# Altium footprint library WR-TBL_Spring Clamp.PcbLib: 258 footprints (part 9 of 17)
Each footprint in its own frame and in the unit in brackets; x right, y up, seen from the top. Pads: shape width x height; smd on the part's side, far side on the other; paste and mask are expansions set on the pad; w line width, h text height; cw(c..) or ccw(c..) is an arc to the next point about the centre after c.
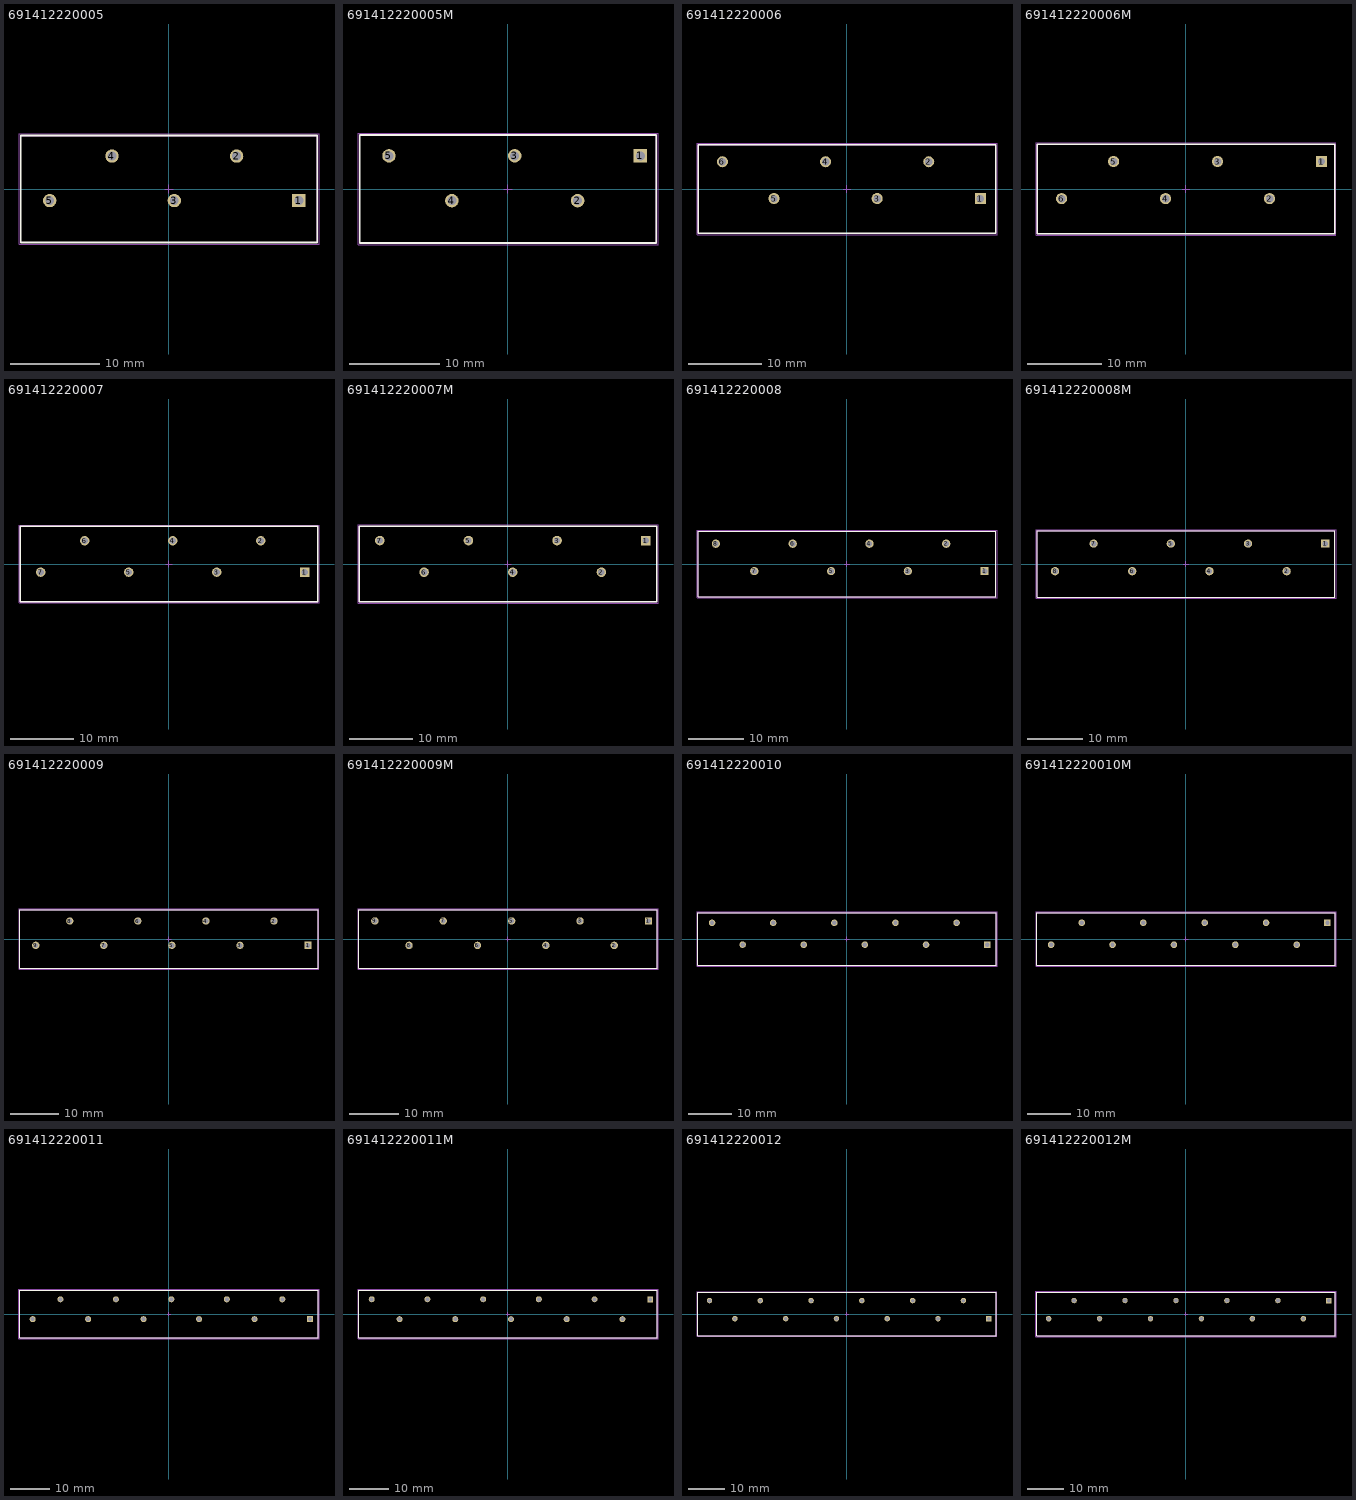
[diagram p8: the footprints below, top view; thin cyan lines are the x and y axes]

## 691412220005 [mm] "7.00 mm Screwless 45deg Entry, 5p"
height 13.2
pads (5):
  rect 1.5x1.5 hole 1: 1(14.595,-1.3)
  round 1.5 hole 1: 2(7.595,3.7) 3(0.595,-1.3) 4(-6.405,3.7) 5(-13.405,-1.3)
Top Overlay:
  lines w0.2: -16.655,-6 -16.655,6 16.655,6 16.655,-6 -16.655,-6
Mechanical 13:
  lines w0.1: -16.655,-6 16.655,-6 16.655,6 -16.655,6 -16.655,-6
Mechanical 15:
  lines w0.05: -0.5,0 0.5,0 ; 0,-0.5 0,0.5 ; -16.855,-6.2 16.855,-6.2 16.855,6.2 -16.855,6.2 -16.855,-6.2
3D body "691412220005.stp": height 13.28, standoff -3.52, extent -16.655,-6 16.655,6

## 691412220005M [mm] "7.00 mm Screwless 45deg Entry Mirror Version, 5p"
height 13.2
pads (5):
  rect 1.5x1.5 hole 1: 1(14.75,3.7)
  round 1.5 hole 1: 2(7.75,-1.3) 3(0.75,3.7) 4(-6.25,-1.3) 5(-13.25,3.7)
Top Overlay:
  lines w0.2: -16.5,-6 -16.5,6 16.5,6 16.5,-6 -16.5,-6
Mechanical 13:
  lines w0.1: -16.5,-6 16.5,-6 16.5,6 -16.5,6 -16.5,-6
Mechanical 15:
  lines w0.05: -0.5,0 0.5,0 ; 0,-0.5 0,0.5 ; -16.7,-6.2 -16.7,6.2 16.7,6.2 16.7,-6.2 -16.7,-6.2
3D body "691412220005M.stp": height 13.28, standoff -3.52, extent -16.5,-6 16.5,6

## 691412220006 [mm] "7.00 mm Screwless 45deg Entry, 6p"
height 13.2
pads (6):
  rect 1.5x1.5 hole 1: 1(18.095,-1.3)
  round 1.5 hole 1: 2(11.095,3.7) 3(4.095,-1.3) 4(-2.905,3.7) 5(-9.905,-1.3) 6(-16.905,3.7)
Top Overlay:
  lines w0.2: -20.155,-6 20.155,-6 20.155,6 -20.155,6 -20.155,-6
Mechanical 13:
  lines w0.1: -20.155,-6 -20.155,6 20.155,6 20.155,-6 -20.155,-6
Mechanical 15:
  lines w0.05: -0.5,0 0.5,0 ; 0,-0.5 0,0.5 ; -20.355,-6.2 -20.355,6.2 20.355,6.2 20.355,-6.2 -20.355,-6.2
3D body "691412220006.stp": height 13.28, standoff -3.52, extent -20.155,-6 20.155,6

## 691412220006M [mm] "7.00 mm Screwless 45deg Entry Mirror Version, 6p"
height 13.2
pads (6):
  rect 1.5x1.5 hole 1: 1(18.25,3.7)
  round 1.5 hole 1: 2(11.25,-1.3) 3(4.25,3.7) 4(-2.75,-1.3) 5(-9.75,3.7) 6(-16.75,-1.3)
Top Overlay:
  lines w0.2: -20,-6 -20,6 20,6 20,-6 -20,-6
Mechanical 13:
  lines w0.1: -20,-6 20,-6 20,6 -20,6 -20,-6
Mechanical 15:
  lines w0.05: -0.5,0 0.5,0 ; 0,-0.5 0,0.5 ; -20.2,-6.2 -20.2,6.2 20.2,6.2 20.2,-6.2 -20.2,-6.2
3D body "691412220006M.stp": height 13.28, standoff -3.52, extent -20,-6 20,6

## 691412220007 [mm] "7.00 mm Screwless 45deg Entry, 7p"
height 13.2
pads (7):
  rect 1.5x1.5 hole 1: 1(21.595,-1.3)
  round 1.5 hole 1: 2(14.595,3.7) 3(7.595,-1.3) 4(0.595,3.7) 5(-6.405,-1.3) 6(-13.405,3.7) 7(-20.405,-1.3)
Top Overlay:
  lines w0.2: -23.655,-6 -23.655,6 23.655,6 23.655,-6 -23.655,-6
Mechanical 13:
  lines w0.1: -23.655,-6 23.655,-6 23.655,6 -23.655,6 -23.655,-6
Mechanical 15:
  lines w0.05: -0.5,0 0.5,0 ; 0,-0.5 0,0.5 ; -23.855,-6.2 23.855,-6.2 23.855,6.2 -23.855,6.2 -23.855,-6.2
3D body "691412220007.stp": height 13.28, standoff -3.52, extent -23.655,-6 23.655,6

## 691412220007M [mm] "7.00 mm Screwless 45deg Entry Mirror Version, 7p"
height 13.2
pads (7):
  rect 1.5x1.5 hole 1: 1(21.75,3.7)
  round 1.5 hole 1: 2(14.75,-1.3) 3(7.75,3.7) 4(0.75,-1.3) 5(-6.25,3.7) 6(-13.25,-1.3) 7(-20.25,3.7)
Top Overlay:
  lines w0.2: -23.5,-6 -23.5,6 23.5,6 23.5,-6 -23.5,-6
Mechanical 13:
  lines w0.1: -23.5,-6 23.5,-6 23.5,6 -23.5,6 -23.5,-6
Mechanical 15:
  lines w0.05: -0.5,0 0.5,0 ; 0,-0.5 0,0.5 ; -23.7,-6.2 -23.7,6.2 23.7,6.2 23.7,-6.2 -23.7,-6.2
3D body "691412220007M.stp": height 13.28, standoff -3.52, extent -23.5,-6 23.5,6

## 691412220008 [mm] "7.00 mm Screwless 45deg Entry, 8p"
height 13.2
pads (8):
  rect 1.5x1.5 hole 1: 1(25.095,-1.3)
  round 1.5 hole 1: 2(18.095,3.7) 3(11.095,-1.3) 4(4.095,3.7) 5(-2.905,-1.3) 6(-9.905,3.7) 7(-16.905,-1.3) 8(-23.905,3.7)
Top Overlay:
  lines w0.2: -27.155,-6 27.155,-6 27.155,6 -27.155,6 -27.155,-6
Mechanical 13:
  lines w0.1: -27.155,-6 -27.155,6 27.155,6 27.155,-6 -27.155,-6
Mechanical 15:
  lines w0.05: -0.5,0 0.5,0 ; 0,-0.5 0,0.5 ; -27.355,-6.2 -27.355,6.2 27.355,6.2 27.355,-6.2 -27.355,-6.2
3D body "691412220008.stp": height 13.28, standoff -3.52, extent -27.155,-6 27.155,6

## 691412220008M [mm] "7.00 mm Screwless 45deg Entry Mirror Version, 8p"
height 13.2
pads (8):
  rect 1.5x1.5 hole 1: 1(25.25,3.7)
  round 1.5 hole 1: 2(18.25,-1.3) 3(11.25,3.7) 4(4.25,-1.3) 5(-2.75,3.7) 6(-9.75,-1.3) 7(-16.75,3.7) 8(-23.75,-1.3)
Top Overlay:
  lines w0.2: -27,-6 27,-6 27,6 -27,6 -27,-6
Mechanical 13:
  lines w0.1: -27,-6 -27,6 27,6 27,-6 -27,-6
Mechanical 15:
  lines w0.05: -0.5,0 0.5,0 ; 0,-0.5 0,0.5 ; -27.2,-6.2 27.2,-6.2 27.2,6.2 -27.2,6.2 -27.2,-6.2
3D body "691412220008M.stp": height 13.28, standoff -3.52, extent -27,-6 27,6

## 691412220009 [mm] "7.00 mm Screwless 45deg Entry, 9p"
height 13.2
pads (9):
  rect 1.5x1.5 hole 1: 1(28.595,-1.3)
  round 1.5 hole 1: 2(21.595,3.7) 3(14.595,-1.3) 4(7.595,3.7) 5(0.595,-1.3) 6(-6.405,3.7) 7(-13.405,-1.3) 8(-20.405,3.7) 9(-27.405,-1.3)
Top Overlay:
  lines w0.2: -30.655,-6 30.655,-6 30.655,6 -30.655,6 -30.655,-6
Mechanical 13:
  lines w0.1: -30.655,-6 -30.655,6 30.655,6 30.655,-6 -30.655,-6
Mechanical 15:
  lines w0.05: -0.5,0 0.5,0 ; 0,-0.5 0,0.5 ; -30.855,-6.2 -30.855,6.2 30.855,6.2 30.855,-6.2 -30.855,-6.2
3D body "691412220009.stp": height 13.28, standoff -3.52, extent -30.655,-6 30.655,6

## 691412220009M [mm] "7.00 mm Screwless 45deg Entry Mirror Version, 9p"
height 13.2
pads (9):
  rect 1.5x1.5 hole 1: 1(28.75,3.7)
  round 1.5 hole 1: 2(21.75,-1.3) 3(14.75,3.7) 4(7.75,-1.3) 5(0.75,3.7) 6(-6.25,-1.3) 7(-13.25,3.7) 8(-20.25,-1.3) 9(-27.25,3.7)
Top Overlay:
  lines w0.2: -30.5,-6 -30.5,6 30.5,6 30.5,-6 -30.5,-6
Mechanical 13:
  lines w0.1: -30.5,-6 30.5,-6 30.5,6 -30.5,6 -30.5,-6
Mechanical 15:
  lines w0.05: -0.5,0 0.5,0 ; 0,-0.5 0,0.5 ; -30.7,-6.2 -30.7,6.2 30.7,6.2 30.7,-6.2 -30.7,-6.2
3D body "691412220009M.stp": height 13.28, standoff -3.52, extent -30.5,-6 30.5,6

## 691412220010 [mm] "7.00 mm Screwless 45deg Entry, 10p"
height 13.2
pads (10):
  rect 1.5x1.5 hole 1: 1(32.095,-1.3)
  round 1.5 hole 1: 2(25.095,3.7) 3(18.095,-1.3) 4(11.095,3.7) 5(4.095,-1.3) 6(-2.905,3.7) 7(-9.905,-1.3) 8(-16.905,3.7) 9(-23.905,-1.3) 10(-30.905,3.7)
Top Overlay:
  lines w0.2: -34.155,-6 34.155,-6 34.155,6 -34.155,6 -34.155,-6
Mechanical 13:
  lines w0.1: -34.155,-6 -34.155,6 34.155,6 34.155,-6 -34.155,-6
Mechanical 15:
  lines w0.05: -0.5,0 0.5,0 ; 0,-0.5 0,0.5 ; -34.355,-6.2 -34.355,6.2 34.355,6.2 34.355,-6.2 -34.355,-6.2
3D body "691412220010.stp": height 13.28, standoff -3.52, extent -34.155,-6 34.155,6

## 691412220010M [mm] "7.00 mm Screwless 45deg Entry Mirror Version, 10p"
height 13.2
pads (10):
  rect 1.5x1.5 hole 1: 1(32.25,3.7)
  round 1.5 hole 1: 2(25.25,-1.3) 3(18.25,3.7) 4(11.25,-1.3) 5(4.25,3.7) 6(-2.75,-1.3) 7(-9.75,3.7) 8(-16.75,-1.3) 9(-23.75,3.7) 10(-30.75,-1.3)
Top Overlay:
  lines w0.2: -34,-6 34,-6 34,6 -34,6 -34,-6
Mechanical 13:
  lines w0.1: -34,-6 -34,6 34,6 34,-6 -34,-6
Mechanical 15:
  lines w0.05: -0.5,0 0.5,0 ; 0,-0.5 0,0.5 ; -34.2,-6.2 34.2,-6.2 34.2,6.2 -34.2,6.2 -34.2,-6.2
3D body "691412220010M.stp": height 13.28, standoff -3.52, extent -34,-6 34,6

## 691412220011 [mm] "7.00 mm Screwless 45deg Entry, 11p"
height 13.2
pads (11):
  rect 1.5x1.5 hole 1: 1(35.595,-1.3)
  round 1.5 hole 1: 2(28.595,3.7) 3(21.595,-1.3) 4(14.595,3.7) 5(7.595,-1.3) 6(0.595,3.7) 7(-6.405,-1.3) 8(-13.405,3.7) 9(-20.405,-1.3) 10(-27.405,3.7) 11(-34.405,-1.3)
Top Overlay:
  lines w0.2: -37.655,-6 37.655,-6 37.655,6 -37.655,6 -37.655,-6
Mechanical 13:
  lines w0.1: -37.655,-6 -37.655,6 37.655,6 37.655,-6 -37.655,-6
Mechanical 15:
  lines w0.05: -0.5,0 0.5,0 ; 0,-0.5 0,0.5 ; -37.855,-6.2 -37.855,6.2 37.855,6.2 37.855,-6.2 -37.855,-6.2
3D body "691412220011.stp": height 13.28, standoff -3.52, extent -37.655,-6 37.655,6

## 691412220011M [mm] "7.00 mm Screwless 45deg Entry Mirror Version, 11p"
height 13.2
pads (11):
  rect 1.5x1.5 hole 1: 1(35.75,3.7)
  round 1.5 hole 1: 2(28.75,-1.3) 3(21.75,3.7) 4(14.75,-1.3) 5(7.75,3.7) 6(0.75,-1.3) 7(-6.25,3.7) 8(-13.25,-1.3) 9(-20.25,3.7) 10(-27.25,-1.3) 11(-34.25,3.7)
Top Overlay:
  lines w0.2: -37.5,-6 -37.5,6 37.5,6 37.5,-6 -37.5,-6
Mechanical 13:
  lines w0.1: -37.5,-6 37.5,-6 37.5,6 -37.5,6 -37.5,-6
Mechanical 15:
  lines w0.05: -0.5,0 0.5,0 ; 0,-0.5 0,0.5 ; -37.7,-6.2 -37.7,6.2 37.7,6.2 37.7,-6.2 -37.7,-6.2
3D body "691412220011M.stp": height 13.28, standoff -3.52, extent -37.5,-6 37.5,6

## 691412220012 [mm] "7.00 mm Screwless 45deg Entry, 12p"
height 13.2
pads (12):
  rect 1.5x1.5 hole 1: 1(39.095,-1.3)
  round 1.5 hole 1: 2(32.095,3.7) 3(25.095,-1.3) 4(18.095,3.7) 5(11.095,-1.3) 6(4.095,3.7) 7(-2.905,-1.3) 8(-9.905,3.7) 9(-16.905,-1.3) 10(-23.905,3.7) 11(-30.905,-1.3) 12(-37.905,3.7)
Top Overlay:
  lines w0.2: -41.155,-6 -41.155,6 41.155,6 41.155,-6 -41.155,-6
Mechanical 13:
  lines w0.1: -41.155,-6 41.155,-6 41.155,6 -41.155,6 -41.155,-6
Mechanical 15:
  lines w0.05: -0.5,0 0.5,0 ; 0,-0.5 0,0.5 ; -41.355,-6.2 41.355,-6.2 41.355,6.2 -41.355,6.2 -41.355,-6.2
3D body "691412220012.stp": height 13.28, standoff -3.52, extent -41.155,-6 41.155,6

## 691412220012M [mm] "7.00 mm Screwless 45deg Entry Mirror Version, 12p"
height 13.2
pads (12):
  rect 1.5x1.5 hole 1: 1(39.25,3.7)
  round 1.5 hole 1: 2(32.25,-1.3) 3(25.25,3.7) 4(18.25,-1.3) 5(11.25,3.7) 6(4.25,-1.3) 7(-2.75,3.7) 8(-9.75,-1.3) 9(-16.75,3.7) 10(-23.75,-1.3) 11(-30.75,3.7) 12(-37.75,-1.3)
Top Overlay:
  lines w0.2: -41,-6 -41,6 41,6 41,-6 -41,-6
Mechanical 13:
  lines w0.1: -41,-6 41,-6 41,6 -41,6 -41,-6
Mechanical 15:
  lines w0.05: -0.5,0 0.5,0 ; 0,-0.5 0,0.5 ; -41.2,-6.2 -41.2,6.2 41.2,6.2 41.2,-6.2 -41.2,-6.2
3D body "691412220012M.stp": height 13.28, standoff -3.52, extent -41,-6 41,6